# Altium footprint library LukaLIBRARY.PcbLib: 784 footprints (part 17 of 49)
Each footprint in its own frame and in the unit in brackets; x right, y up, seen from the top. Pads: shape width x height; smd on the part's side, far side on the other; paste and mask are expansions set on the pad; w line width, h text height; cw(c..) or ccw(c..) is an arc to the next point about the centre after c.
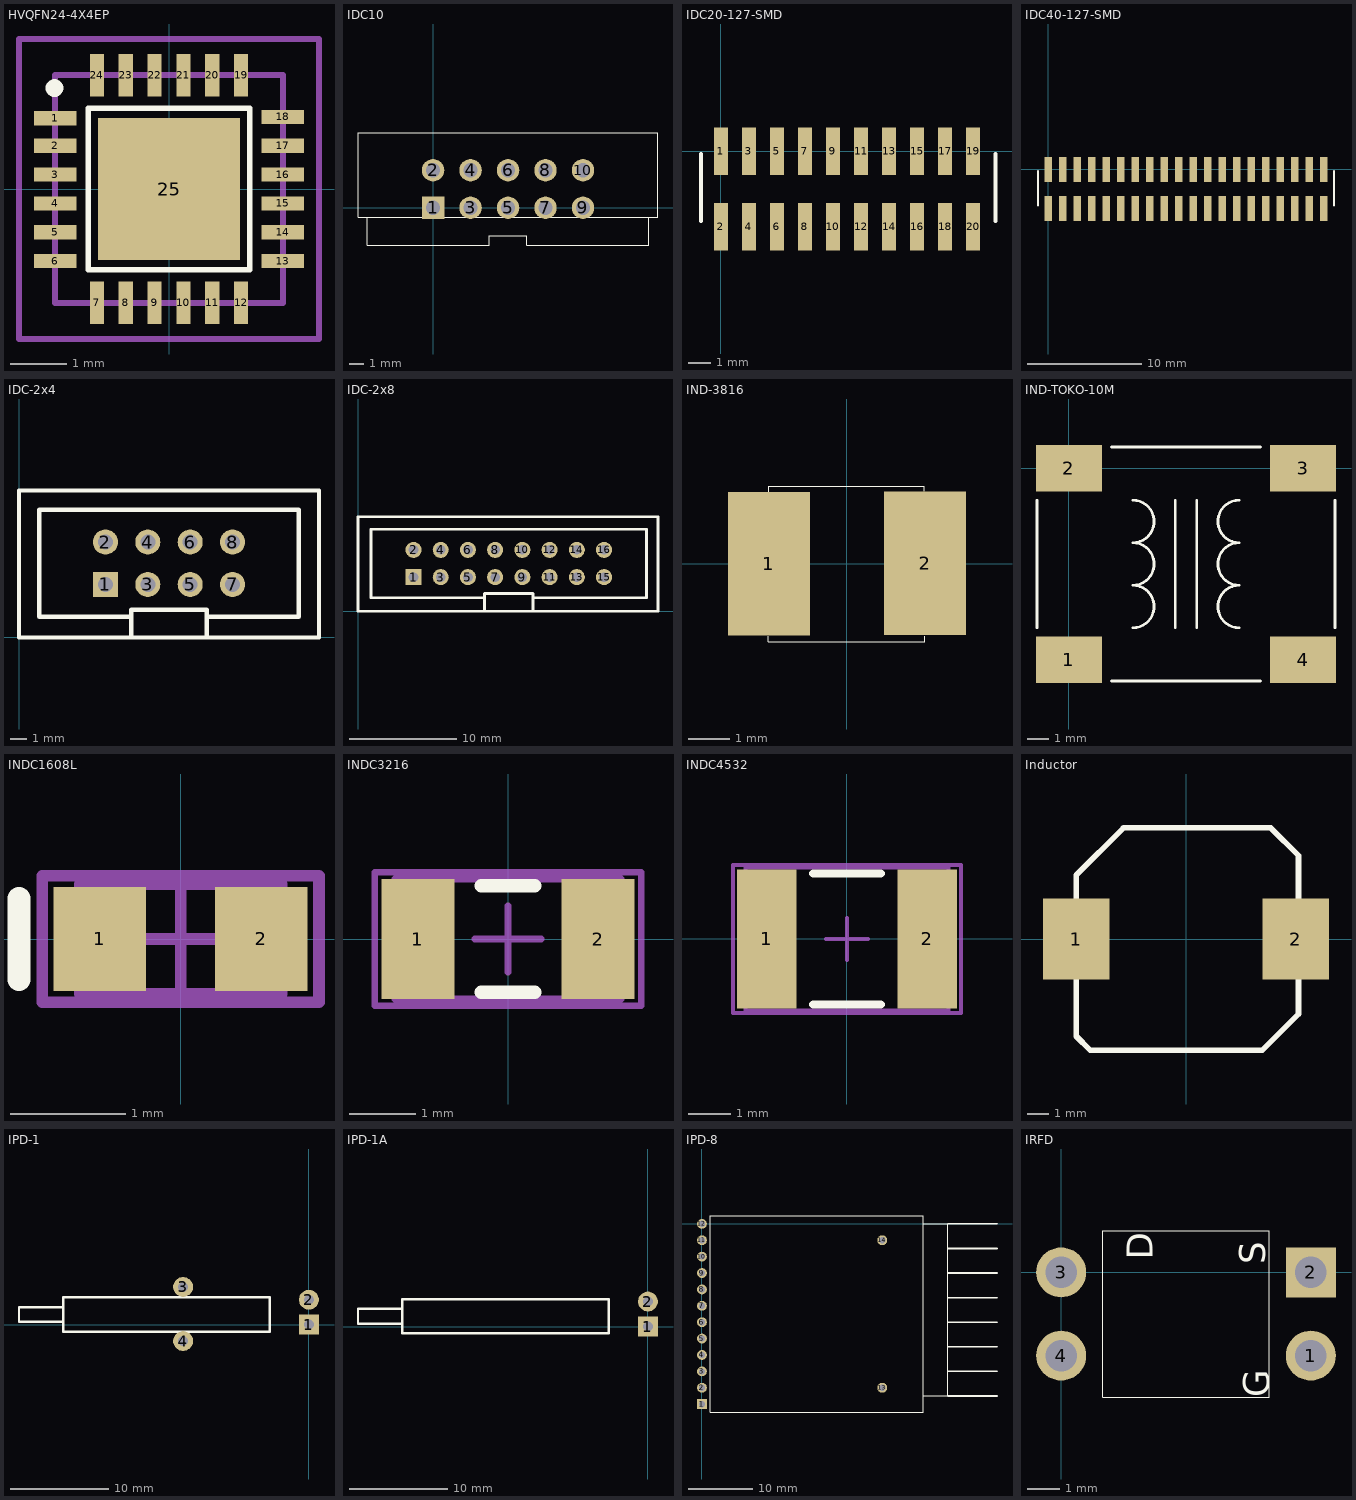
[diagram p16: the footprints below, top view; thin cyan lines are the x and y axes]

## HVQFN24-4X4EP [mm]
pads (25):
  rect 0.75x0.25 smd: 1(-2.007,1.245) 2(-2.007,0.762) 3(-2.007,0.254) 4(-2.007,-0.254) 5(-2.007,-0.762) 6(-2.007,-1.27) 13(2.007,-1.27) 14(2.007,-0.762) 15(2.007,-0.254) 16(2.007,0.254) 17(2.007,0.762) 18(2.007,1.27)
  rect 0.25x0.75 smd: 7(-1.27,-2.007) 8(-0.762,-2.007) 9(-0.254,-2.007) 10(0.254,-2.007) 11(0.762,-2.007) 12(1.27,-2.007) 19(1.27,2.007) 20(0.762,2.007) 21(0.254,2.007) 22(-0.254,2.007) 23(-0.762,2.007) 24(-1.27,2.007)
  rect 2.5x2.5 smd: 25(0,0)
Top Overlay:
  circle w0.25: c-2.017,1.778 r0.03
  lines w0.1: -1.422,-1.422 1.422,-1.422 1.422,1.422 -1.422,1.422 -1.422,-1.422
Mechanical 13:
  lines w0.1: -2.007,-2.007 -2.007,2.007 2.007,2.007 2.007,-2.007 -2.007,-2.007
Mechanical 15:
  lines w0.1: -2.642,-2.642 2.642,-2.642 2.642,2.642 -2.642,2.642 -2.642,-2.642

## IDC10 [mil]
pads (10):
  rect 60x60 hole 38 mask-1000: 1(0,0)
  round 60 hole 38 mask-1000: 2(0,100) 3(100,0) 4(100,100) 5(200,0) 6(200,100) 7(300,0) 8(300,100) 9(400,0) 10(400,100)
Top Overlay:
  lines w3: -175,-25 -175,-100 150,-100 150,-75 250,-75 250,-100 575,-100 575,-25 ; -200,-25 -200,200 600,200 600,-25 -200,-25
Top Solder:
  drawing of 10 lines, arcs and shapes, not listed
Bottom Solder:
  drawing of 10 lines, arcs and shapes, not listed

## IDC20-127-SMD [mil]
pads (20):
  rect 25x85 smd: 1(0,0) 2(0,-135) 3(50,0) 4(50,-135) 5(100,0) 6(100,-135) 7(150,0) 8(150,-135) 9(200,0) 10(200,-135) 11(250,0) 12(250,-135) 13(300,0) 14(300,-135) 15(350,0) 16(350,-135) 17(400,0) 18(400,-135) 19(450,0) 20(450,-135)
Top Overlay:
  lines w7: -35,-125 -35,-5 ; 490,-125 490,-5

## IDC40-127-SMD [mil]
pads (40):
  rect 25x85 smd: 1(0,0) 2(0,-135) 3(50,0) 4(50,-135) 5(100,0) 6(100,-135) 7(150,0) 8(150,-135) 9(200,0) 10(200,-135) 11(250,0) 12(250,-135) 13(300,0) 14(300,-135) 15(350,0) 16(350,-135) 17(400,0) 18(400,-135) 19(450,0) 20(450,-135) 21(500,0) 22(500,-135) 23(550,0) 24(550,-135) 25(600,0) 26(600,-135) 27(650,0) 28(650,-135) 29(700,0) 30(700,-135) 31(750,0) 32(750,-135) 33(800,0) 34(800,-135) 35(850,0) 36(850,-135) 37(900,0) 38(900,-135) 39(950,0) 40(950,-135)
Top Overlay:
  lines w7: -35,-125 -35,-5 ; 985,-125 985,-5

## IDC-2x4 [mm] "IDC Male Connector"
pads (8):
  rect 1.5x1.5 hole 0.9: 1(5.182,3.175)
  round 1.5 hole 0.9: 2(5.182,5.715) 3(7.722,3.175) 4(7.722,5.715) 5(10.262,3.175) 6(10.262,5.715) 7(12.802,3.175) 8(12.802,5.715)
Top Overlay:
  lines w0.254: 6.68,1.245 1.219,1.245 1.219,7.645 16.764,7.645 16.764,1.245 ; 6.731,0 6.731,1.651 11.252,1.651 11.252,0 ; 11.252,1.245 16.739,1.245 ; 0,0 0,8.8 17.983,8.8 17.983,0 0,0

## IDC-2x8 [mm] "IDC Male Connector"
pads (16):
  rect 1.5x1.5 hole 0.9: 1(5.182,3.175)
  round 1.5 hole 0.9: 2(5.182,5.715) 3(7.722,3.175) 4(7.722,5.715) 5(10.262,3.175) 6(10.262,5.715) 7(12.802,3.175) 8(12.802,5.715) 9(15.342,3.175) 10(15.342,5.715) 11(17.882,3.175) 12(17.882,5.715) 13(20.422,3.175) 14(20.422,5.715) 15(22.962,3.175) 16(22.962,5.715)
Top Overlay:
  lines w0.254: 11.76,1.245 1.219,1.245 1.219,7.645 26.924,7.645 26.924,1.245 16.383,1.245 ; 11.811,0 11.811,1.651 16.332,1.651 16.332,0 ; 0,0 28,0 28,8.8 0,8.8 0,0

## IND-3816 [mm]
pads (2):
  rect 2x3.5 smd mask-25.4: 1(-1.9,0) 2(1.91,0.01)
Top Overlay:
  lines w0.03: -1.91,-1.76 -1.91,-1.9 1.9,-1.9 1.9,-1.76 ; -1.9,1.76 -1.9,1.89 1.89,1.89 1.89,1.77
Top Solder:
  region: -0.9,-1.75 -0.9,1.75 -2.9,1.75 -2.9,-1.75
  region: 2.91,-1.74 2.91,1.76 0.91,1.76 0.91,-1.74

## IND-TOKO-10M [mm]
pads (4):
  rect 3.1x2.2 smd mask-25.4: 1(0,-9) 2(0,0) 3(11,0) 4(11,-9)
Top Overlay:
  lines w0.127: -1.5,-7.5 -1.5,-1.5 ; 2,-10 9,-10 ; 2,1 9,1 ; 3,-7.5 ccw(c3,-6.5) 3,-5.5 ccw(c3,-4.5) 3,-3.5 ccw(c3,-2.5) 3,-1.5 ; 5,-7.5 5,-1.5 ; 6,-7.5 6,-1.5 ; 8,-7.5 cw(c8,-6.5) 8,-5.5 cw(c8,-4.5) 8,-3.5 cw(c8,-2.5) 8,-1.5 ; 12.5,-7.5 12.5,-1.5
Top Solder:
  region: -1.55,-10.1 1.55,-10.1 1.55,-7.9 -1.55,-7.9
  region: -1.55,-1.1 1.55,-1.1 1.55,1.1 -1.55,1.1
  region: 9.45,-10.1 12.55,-10.1 12.55,-7.9 9.45,-7.9
  region: 9.45,-1.1 12.55,-1.1 12.55,1.1 9.45,1.1

## INDC1608L [mm] "Chip Inductor, Body 1.6x0.8mm, IPC High Density"
height 0.55
pads (2):
  rect 0.8x0.9 smd: 1(-0.7,0) 2(0.7,0)
Top Overlay:
  lines w0.2: -1.4,-0.35 -1.4,0.35
Mechanical 13:
  lines w0.1: -0.875,-0.475 0.875,-0.475 0.875,0.475 -0.875,0.475 -0.875,-0.475
Mechanical 15:
  lines w0.1: -0.475,0 0.475,0 ; 0,-0.475 0,0.475 ; -1.2,-0.55 1.2,-0.55 1.2,0.55 -1.2,0.55 -1.2,-0.55
3D body: height 0.55, standoff 0, extent -0.875,-0.475 0.875,0.475

## INDC3216 [mm] "Chip Inductor, Body 3.2x1.6mm, IPC High Density"
height 0.55
pads (2):
  rect 1.1x1.8 smd: 1(-1.35,0) 2(1.35,0)
Top Overlay:
  lines w0.2: -0.4,-0.8 0.4,-0.8 ; -0.4,0.8 0.4,0.8
Mechanical 13:
  lines w0.1: -1.7,-0.9 1.7,-0.9 1.7,0.9 -1.7,0.9 -1.7,-0.9
Mechanical 15:
  lines w0.1: -0.5,0 0.5,0 ; 0,-0.5 0,0.5 ; -2,-1 2,-1 2,1 -2,1 -2,-1
3D body: height 0.55, standoff 0, extent -1.7,-0.9 1.7,0.9

## INDC4532 [mm] "Chip Inductor, Body 4.5x3.2mm, IPC High Density"
height 0.55
pads (2):
  rect 1.4x3.3 smd: 1(-1.9,0) 2(1.9,0)
Top Overlay:
  lines w0.2: -0.8,-1.55 0.8,-1.55 ; -0.8,1.55 0.8,1.55
Mechanical 13:
  lines w0.1: -2.4,-1.7 -2.4,1.7 2.4,1.7 2.4,-1.7 -2.4,-1.7
Mechanical 15:
  lines w0.1: -0.5,0 0.5,0 ; 0,-0.5 0,0.5 ; -2.7,-1.75 -2.7,1.75 2.7,1.75 2.7,-1.75 -2.7,-1.75
3D body: height 0.55, standoff 0, extent -2.4,-1.7 2.4,1.7

## Inductor [mil]
pads (2):
  rect 120x145 smd: 1(-197.5,0) 2(197.5,0)
Top Overlay:
  lines w10: -197.5,-175 -197.5,75 -197.5,115 -112.5,200 152.5,200 202.5,150 202.5,65 202.5,-135 137.5,-200 -172.5,-200 -197.5,-175

## IPD-1 [mil]
pads (4):
  rect 80x80 hole 40 mask-1000: 1(0,0)
  round 80 hole 40 mask-1000: 2(0,100) 3(-503.94,151.18) 4(-503.94,-65.35)
Top Overlay:
  lines w10: -984.25,11.81 -1161.42,11.81 -1161.42,70.87 -984.25,70.87 ; -984.25,-27.56 -984.25,110.24 -157.48,110.24 -157.48,-27.56 -984.25,-27.56
Top Solder:
  region: -503.94,-25.01 -514.38,-26.38 -524.11,-30.41 -532.47,-36.83 -538.88,-45.18 -542.91,-54.91 -544.28,-65.35 -542.91,-75.8 -538.88,-85.53 -532.47,-93.88 -524.11,-100.29 -514.38,-104.32 -503.94,-105.7 -493.49,-104.32 -483.76,-100.29 -475.41,-93.88 -469,-85.53 -464.97,-75.8 -463.59,-65.35 -464.97,-54.91 -469,-45.18 -475.41,-36.83 -483.76,-30.41 -493.49,-26.38
  region: -503.94,191.53 -514.38,190.15 -524.11,186.12 -532.47,179.71 -538.88,171.35 -542.91,161.62 -544.28,151.18 -542.91,140.74 -538.88,131.01 -532.47,122.65 -524.11,116.24 -514.38,112.21 -503.94,110.84 -493.49,112.21 -483.76,116.24 -475.41,122.65 -469,131.01 -464.97,140.74 -463.59,151.18 -464.97,161.62 -469,171.35 -475.41,179.71 -483.76,186.12 -493.49,190.15
  region: 0,140.35 -10.44,138.97 -20.17,134.94 -28.53,128.53 -34.94,120.17 -38.97,110.44 -40.35,100 -38.97,89.56 -34.94,79.83 -28.53,71.47 -20.17,65.06 -10.44,61.03 0,59.65 10.44,61.03 20.17,65.06 28.53,71.47 34.94,79.83 38.97,89.56 40.35,100 38.97,110.44 34.94,120.17 28.53,128.53 20.17,134.94 10.44,138.97
  region: -40,-40 40,-40 40,40 -40,40
Bottom Solder:
  region: -503.94,-25.01 -514.38,-26.38 -524.11,-30.41 -532.47,-36.83 -538.88,-45.18 -542.91,-54.91 -544.28,-65.35 -542.91,-75.8 -538.88,-85.53 -532.47,-93.88 -524.11,-100.29 -514.38,-104.32 -503.94,-105.7 -493.49,-104.32 -483.76,-100.29 -475.41,-93.88 -469,-85.53 -464.97,-75.8 -463.59,-65.35 -464.97,-54.91 -469,-45.18 -475.41,-36.83 -483.76,-30.41 -493.49,-26.38
  region: -503.94,191.53 -514.38,190.15 -524.11,186.12 -532.47,179.71 -538.88,171.35 -542.91,161.62 -544.28,151.18 -542.91,140.74 -538.88,131.01 -532.47,122.65 -524.11,116.24 -514.38,112.21 -503.94,110.84 -493.49,112.21 -483.76,116.24 -475.41,122.65 -469,131.01 -464.97,140.74 -463.59,151.18 -464.97,161.62 -469,171.35 -475.41,179.71 -483.76,186.12 -493.49,190.15
  region: 0,140.35 -10.44,138.97 -20.17,134.94 -28.53,128.53 -34.94,120.17 -38.97,110.44 -40.35,100 -38.97,89.56 -34.94,79.83 -28.53,71.47 -20.17,65.06 -10.44,61.03 0,59.65 10.44,61.03 20.17,65.06 28.53,71.47 34.94,79.83 38.97,89.56 40.35,100 38.97,110.44 34.94,120.17 28.53,128.53 20.17,134.94 10.44,138.97
  region: -40,-40 40,-40 40,40 -40,40

## IPD-1A [mil]
pads (2):
  rect 80x80 hole 40 mask-1000: 1(0,0)
  round 80 hole 40 mask-1000: 2(0,100)
Top Overlay:
  lines w10: -984.25,11.81 -1161.42,11.81 -1161.42,70.87 -984.25,70.87 ; -984.25,-27.56 -157.48,-27.56 -157.48,110.24 -984.25,110.24 -984.25,-27.56
Top Solder:
  region: -40,-40 40,-40 40,40 -40,40
  region: 0,140.35 -10.44,138.97 -20.17,134.94 -28.53,128.53 -34.94,120.17 -38.97,110.44 -40.35,100 -38.97,89.56 -34.94,79.83 -28.53,71.47 -20.17,65.06 -10.44,61.03 0,59.65 10.44,61.03 20.17,65.06 28.53,71.47 34.94,79.83 38.97,89.56 40.35,100 38.97,110.44 34.94,120.17 28.53,128.53 20.17,134.94 10.44,138.97
Bottom Solder:
  region: -40,-40 40,-40 40,40 -40,40
  region: 0,140.35 -10.44,138.97 -20.17,134.94 -28.53,128.53 -34.94,120.17 -38.97,110.44 -40.35,100 -38.97,89.56 -34.94,79.83 -28.53,71.47 -20.17,65.06 -10.44,61.03 0,59.65 10.44,61.03 20.17,65.06 28.53,71.47 34.94,79.83 38.97,89.56 40.35,100 38.97,110.44 34.94,120.17 28.53,128.53 20.17,134.94 10.44,138.97

## IPD-8 [mil]
pads (14):
  rect 60x60 hole 38 mask-1000: 1(0,-1100)
  round 60 hole 38 mask-1000: 2(0,-1000)
  round 60 hole 38: 3(0,-900) 4(0,-800) 5(0,-700) 6(0,-600) 7(0,-500) 8(0,-400) 9(0,-300) 10(0,-200) 11(0,-100) 12(0,0) 13(1100,-1000) 14(1100,-100)
Top Overlay:
  lines w3: 1350,-1050 1500,-1050 1500,0 1350,0 ; 50,-1150 50,50 1350,50 1350,-1150 50,-1150
  lines w10: 1500,-1050 1800,-1050 ; 1500,-900 1800,-900 ; 1500,-750 1800,-750 ; 1500,-600 1800,-600 ; 1500,-450 1800,-450 ; 1500,-300 1800,-300 ; 1500,-150 1800,-150 ; 1500,0 1600,0 1800,0
Top Solder:
  region: 30,-1070 -30,-1070 -30,-1130 30,-1130
  region: 0,-1030.26 7.83,-1029.23 15.13,-1026.2 21.4,-1021.4 26.2,-1015.13 29.23,-1007.83 30.26,-1000 29.23,-992.17 26.2,-984.87 21.4,-978.6 15.13,-973.79 7.83,-970.77 0,-969.74 -7.83,-970.77 -15.13,-973.79 -21.4,-978.6 -26.2,-984.87 -29.23,-992.17 -30.26,-1000 -29.23,-1007.83 -26.2,-1015.13 -21.4,-1021.4 -15.13,-1026.2 -7.83,-1029.23
Bottom Solder:
  region: 30,-1070 -30,-1070 -30,-1130 30,-1130
  region: 0,-1030.26 7.83,-1029.23 15.13,-1026.2 21.4,-1021.4 26.2,-1015.13 29.23,-1007.83 30.26,-1000 29.23,-992.17 26.2,-984.87 21.4,-978.6 15.13,-973.79 7.83,-970.77 0,-969.74 -7.83,-970.77 -15.13,-973.79 -21.4,-978.6 -26.2,-984.87 -29.23,-992.17 -30.26,-1000 -29.23,-1007.83 -26.2,-1015.13 -21.4,-1021.4 -15.13,-1026.2 -7.83,-1029.23

## IRFD [mil]
pads (4):
  round 60 hole 38 mask-1000: 1(300,-100) 3(0,0) 4(0,-100)
  rect 60x60 hole 38 mask-1000: 2(300,0)
Top Overlay:
  lines w1: 50,-150 50,50 250,50 250,-150 50,-150
  text "G" at 250,-150 h31.25
  text "S" at 245,10 h31.25
  text "D" at 110,15 h31.25
Top Solder:
  region: 0,30.26 -7.83,29.23 -15.13,26.2 -21.4,21.4 -26.2,15.13 -29.23,7.83 -30.26,0 -29.23,-7.83 -26.2,-15.13 -21.4,-21.4 -15.13,-26.2 -7.83,-29.23 0,-30.26 7.83,-29.23 15.13,-26.2 21.4,-21.4 26.2,-15.13 29.23,-7.83 30.26,0 29.23,7.83 26.2,15.13 21.4,21.4 15.13,26.2 7.83,29.23
  region: 270,-30 330,-30 330,30 270,30
  region: 0,-69.74 -7.83,-70.77 -15.13,-73.8 -21.4,-78.6 -26.2,-84.87 -29.23,-92.17 -30.26,-100 -29.23,-107.83 -26.2,-115.13 -21.4,-121.4 -15.13,-126.2 -7.83,-129.23 0,-130.26 7.83,-129.23 15.13,-126.2 21.4,-121.4 26.2,-115.13 29.23,-107.83 30.26,-100 29.23,-92.17 26.2,-84.87 21.4,-78.6 15.13,-73.8 7.83,-70.77
  region: 300,-69.74 292.17,-70.77 284.87,-73.8 278.6,-78.6 273.8,-84.87 270.77,-92.17 269.74,-100 270.77,-107.83 273.8,-115.13 278.6,-121.4 284.87,-126.2 292.17,-129.23 300,-130.26 307.83,-129.23 315.13,-126.2 321.4,-121.4 326.2,-115.13 329.23,-107.83 330.26,-100 329.23,-92.17 326.2,-84.87 321.4,-78.6 315.13,-73.8 307.83,-70.77
Bottom Solder:
  region: 0,30.26 -7.83,29.23 -15.13,26.2 -21.4,21.4 -26.2,15.13 -29.23,7.83 -30.26,0 -29.23,-7.83 -26.2,-15.13 -21.4,-21.4 -15.13,-26.2 -7.83,-29.23 0,-30.26 7.83,-29.23 15.13,-26.2 21.4,-21.4 26.2,-15.13 29.23,-7.83 30.26,0 29.23,7.83 26.2,15.13 21.4,21.4 15.13,26.2 7.83,29.23
  region: 270,-30 330,-30 330,30 270,30
  region: 0,-69.74 -7.83,-70.77 -15.13,-73.8 -21.4,-78.6 -26.2,-84.87 -29.23,-92.17 -30.26,-100 -29.23,-107.83 -26.2,-115.13 -21.4,-121.4 -15.13,-126.2 -7.83,-129.23 0,-130.26 7.83,-129.23 15.13,-126.2 21.4,-121.4 26.2,-115.13 29.23,-107.83 30.26,-100 29.23,-92.17 26.2,-84.87 21.4,-78.6 15.13,-73.8 7.83,-70.77
  region: 300,-69.74 292.17,-70.77 284.87,-73.8 278.6,-78.6 273.8,-84.87 270.77,-92.17 269.74,-100 270.77,-107.83 273.8,-115.13 278.6,-121.4 284.87,-126.2 292.17,-129.23 300,-130.26 307.83,-129.23 315.13,-126.2 321.4,-121.4 326.2,-115.13 329.23,-107.83 330.26,-100 329.23,-92.17 326.2,-84.87 321.4,-78.6 315.13,-73.8 307.83,-70.77